# Altium footprint library mfmc_footprints.PcbLib: 156 footprints (part 6 of 10)
Each footprint in its own frame and in the unit in brackets; x right, y up, seen from the top. Pads: shape width x height; smd on the part's side, far side on the other; paste and mask are expansions set on the pad; w line width, h text height; cw(c..) or ccw(c..) is an arc to the next point about the centre after c.
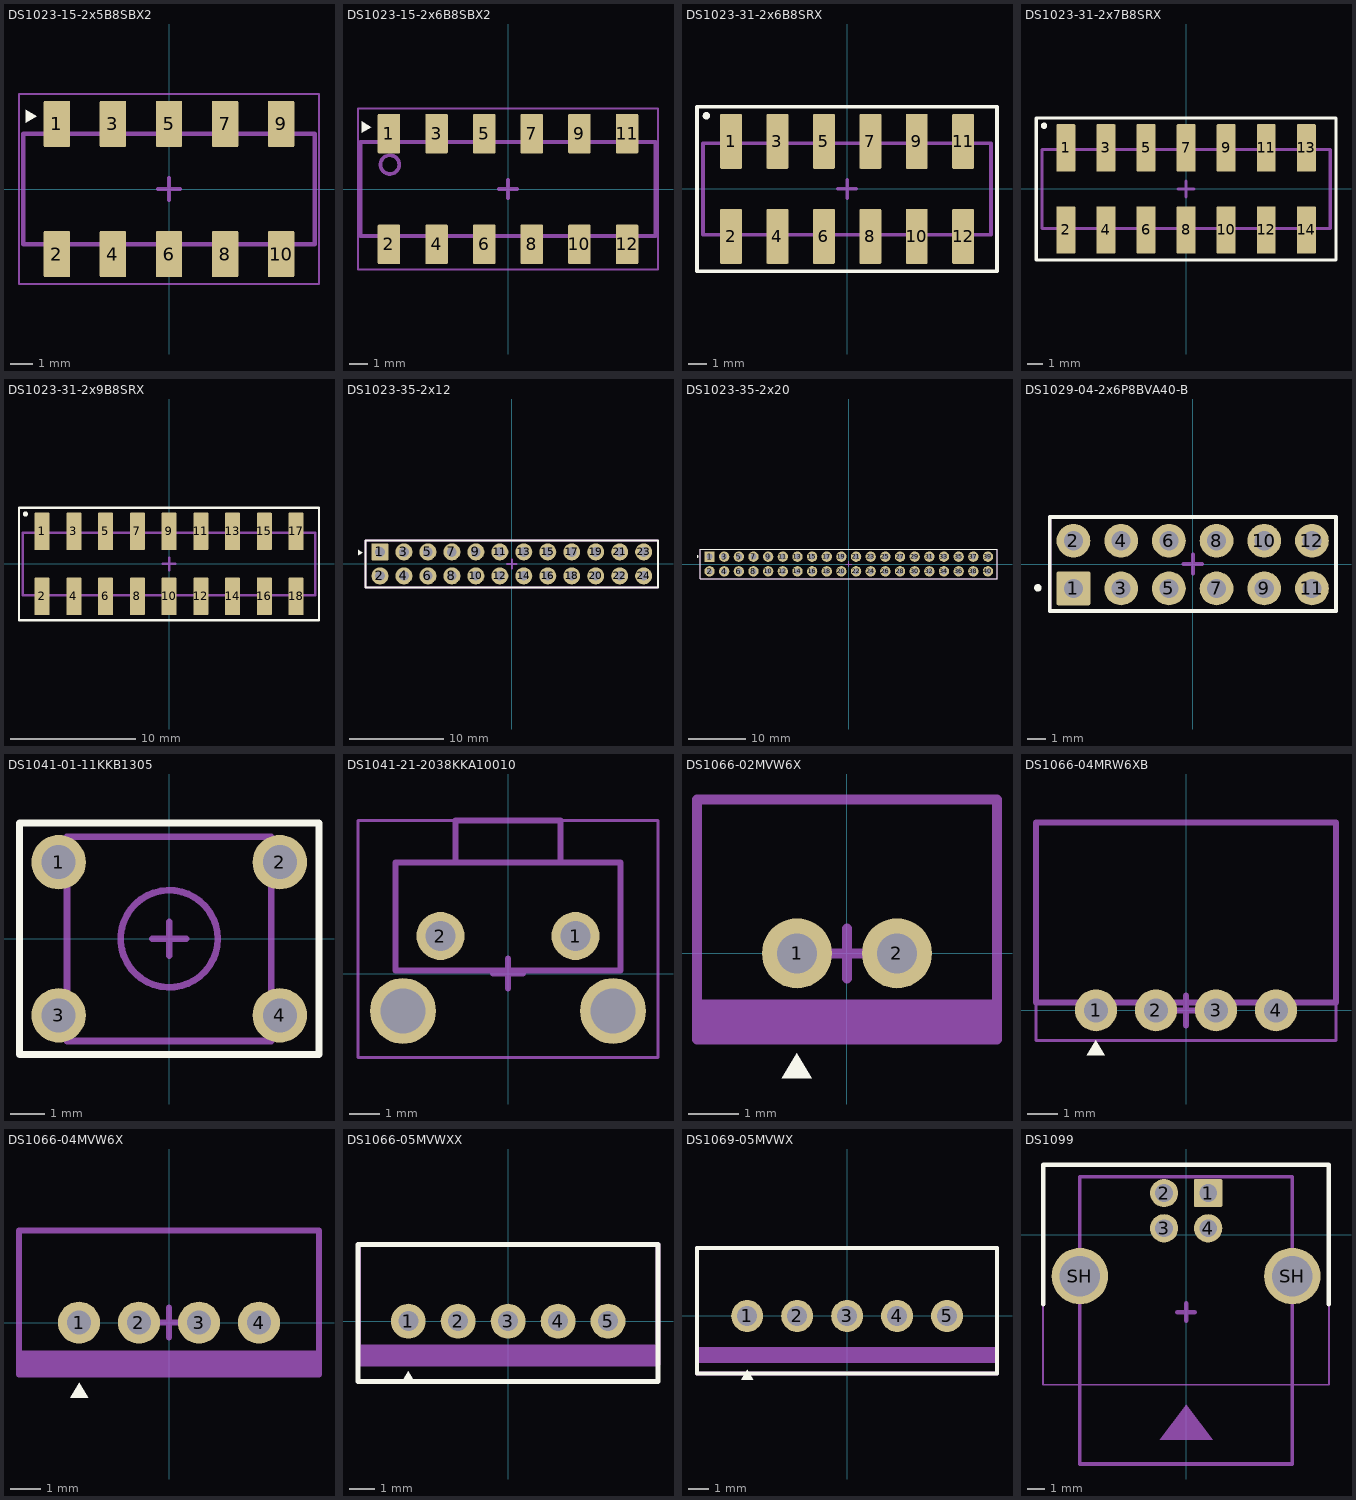
[diagram p5: the footprints below, top view; thin cyan lines are the x and y axes]

## DS1023-15-2x5B8SBX2 [mm] "Female header pitch 2.54mm SMT Type H=5.0"
height 5
pads (10):
  rrect10% 1.2x2.1 smd: 1(-5.08,2.95) 2(-5.08,-2.95) 3(-2.54,2.95) 4(-2.54,-2.95) 5(0,2.95) 6(0,-2.95) 7(2.54,2.95) 8(2.54,-2.95) 9(5.08,2.95) 10(5.08,-2.95)
Top Overlay:
  region: -6.5,3.6 -6,3.3 -6.5,3
Top Courtyard:
  lines w0.1: -6.8,-4.3 6.8,-4.3 6.8,4.3 -6.8,4.3 -6.8,-4.3
  lines w0.2: -0.5,0 0.5,0 ; 0,-0.5 0,0.5
Top Assembly:
  lines w0.2: -6.6,-2.5 6.6,-2.5 6.6,2.5 -6.6,2.5 -6.6,-2.5
Top Designator (Mech10):
  text ".Designator" at -7.618,-0.508 h1.52
3D body "DS1023-15-2x5.STEP": height 6, standoff 0, extent -6.6,-4.25 6.6,4.25

## DS1023-15-2x6B8SBX2 [mm] "Female header pitch 2.54mm SMT Type H=5.0"
height 5
pads (12):
  rrect10% 1.2x2.1 smd: 1(-6.35,2.95) 2(-6.35,-2.95) 3(-3.81,2.95) 4(-3.81,-2.95) 5(-1.27,2.95) 6(-1.27,-2.95) 7(1.27,2.95) 8(1.27,-2.95) 9(3.81,2.95) 10(3.81,-2.95) 11(6.35,2.95) 12(6.35,-2.95)
Top Overlay:
  region: -7.8,3.6 -7.3,3.3 -7.8,3
Top Courtyard:
  lines w0.1: -8,-4.3 8,-4.3 8,4.3 -8,4.3 -8,-4.3
  lines w0.2: -0.5,0 0.5,0 ; 0,-0.5 0,0.5
Top Assembly:
  circle w0.2: c-6.3,1.3 r0.5
  lines w0.2: -7.87,-2.5 7.87,-2.5 7.87,2.5 -7.87,2.5 -7.87,-2.5
Top Designator (Mech10):
  text ".Designator" at -7.618,-0.508 h1.52
3D body "DS1023-15-2x6.STEP": height 6, standoff 0, extent -7.87,-4.25 7.87,4.25

## DS1023-31-2x6B8SRX [mm]
height 9.7
pads (12):
  rrect10% 1.2x3 smd: 1(-6.35,2.6) 2(-6.35,-2.6) 3(-3.81,2.6) 4(-3.81,-2.6) 5(-1.27,2.6) 6(-1.27,-2.6) 7(1.27,2.6) 8(1.27,-2.6) 9(3.81,2.6) 10(3.81,-2.6) 11(6.35,2.6) 12(6.35,-2.6)
Top Overlay:
  circle w0.2: c-7.7,4 r0.1
  lines w0.2: -8.213,-4.513 8.2,-4.513 8.2,4.5 -8.213,4.5 -8.213,-4.513
Top Courtyard:
  lines w0.1: -8.213,-4.513 8.2,-4.513 8.2,4.5 -8.213,4.5 -8.213,-4.513
  lines w0.2: -0.5,0 0.5,0 ; 0,-0.5 0,0.5
Top Assembly:
  lines w0.2: -7.883,-2.513 7.87,-2.513 7.87,2.5 -7.883,2.5 -7.883,-2.513
Top Designator (Mech10):
  text ".Designator" at -7.624,-0.514 h1.52
3D body "DS1023-31-2x6.STEP": height 9.7, standoff 0, extent -7.87,-3.6 7.87,3.6

## DS1023-31-2x7B8SRX [mm]
height 9.7
pads (14):
  rrect10% 1.2x3 smd: 1(-7.62,2.6) 2(-7.62,-2.6) 3(-5.08,2.6) 4(-5.08,-2.6) 5(-2.54,2.6) 6(-2.54,-2.6) 7(0,2.6) 8(0,-2.6) 9(2.54,2.6) 10(2.54,-2.6) 11(5.08,2.6) 12(5.08,-2.6) 13(7.62,2.6) 14(7.62,-2.6)
Top Overlay:
  circle w0.2: c-9,4 r0.1
  lines w0.2: -9.5,-4.5 -9.5,4.5 9.5,4.5 9.5,-4.5 -9.5,-4.5
Top Courtyard:
  lines w0.1: -9.513,-4.513 9.5,-4.513 9.5,4.5 -9.513,4.5 -9.513,-4.513
  lines w0.2: -0.5,0 0.5,0 ; 0,-0.5 0,0.5
Top Assembly:
  lines w0.2: -9.14,-2.5 -9.14,2.5 9.14,2.5 9.14,-2.5 -9.14,-2.5
Top Designator (Mech10):
  text ".Designator" at -7.618,-0.508 h1.52
3D body "DS1023-31-2x7.STEP": height 9.7, standoff 0, extent -9.14,-3.6 9.14,3.6

## DS1023-31-2x9B8SRX [mm]
height 9.7
pads (18):
  rrect10% 1.2x3 smd: 1(-10.16,2.6) 2(-10.16,-2.6) 3(-7.62,2.6) 4(-7.62,-2.6) 5(-5.08,2.6) 6(-5.08,-2.6) 7(-2.54,2.6) 8(-2.54,-2.6) 9(0,2.6) 10(0,-2.6) 11(2.54,2.6) 12(2.54,-2.6) 13(5.08,2.6) 14(5.08,-2.6) 15(7.62,2.6) 16(7.62,-2.6) 17(10.16,2.6) 18(10.16,-2.6)
Top Overlay:
  circle w0.2: c-11.5,4 r0.1
  lines w0.2: -12.013,-4.513 12,-4.513 12,4.5 -12.013,4.5 -12.013,-4.513
Top Courtyard:
  lines w0.1: -12.013,-4.513 12,-4.513 12,4.5 -12.013,4.5 -12.013,-4.513
  lines w0.2: -0.5,0 0.5,0 ; 0,-0.5 0,0.5
Top Assembly:
  lines w0.2: -11.693,-2.513 11.68,-2.513 11.68,2.5 -11.693,2.5 -11.693,-2.513
Top Designator (Mech10):
  text ".Designator" at -7.624,-0.514 h1.52
3D body "1023-31.STEP": height 9.7, standoff 0, extent -11.68,-3.6 11.68,3.6

## DS1023-35-2x12 [mm]
height 13.5
pads (24):
  rrect10% 1.8x1.8 hole 1.02: 1(-13.97,1.27)
  round 1.8 hole 1.02: 2(-13.97,-1.27) 3(-11.43,1.27) 4(-11.43,-1.27) 5(-8.89,1.27) 6(-8.89,-1.27) 7(-6.35,1.27) 8(-6.35,-1.27) 9(-3.81,1.27) 10(-3.81,-1.27) 11(-1.27,1.27) 12(-1.27,-1.27) 13(1.27,1.27) 14(1.27,-1.27) 15(3.81,1.27) 16(3.81,-1.27) 17(6.35,1.27) 18(6.35,-1.27) 19(8.89,1.27) 20(8.89,-1.27) 21(11.43,1.27) 22(11.43,-1.27) 23(13.97,1.27) 24(13.97,-1.27)
Top Overlay:
  region: -16.3,1.5 -15.8,1.2 -16.3,0.9
  lines w0.2: -15.503,-2.513 15.49,-2.513 15.49,2.5 -15.503,2.5 -15.503,-2.513
Top Courtyard:
  lines w0.1: -15.49,-2.5 -15.49,2.5 15.49,2.5 15.49,-2.5 -15.49,-2.5
  lines w0.2: -0.5,0 0.5,0 ; 0,-0.5 0,0.5
Top Assembly:
  circle w0.2: c-13.97,1.27 r0.5
  lines w0.2: -15.49,-2.5 -15.49,2.5 15.49,2.5 15.49,-2.5 -15.49,-2.5
Top Designator (Mech10):
  text ".Designator" at -7.973,-0.514 h1.52
3D body "DS1023-35-2x12.STEP": height 13.5, standoff -3, extent -15.49,-2.475 15.49,2.475

## DS1023-35-2x20 [mm]
height 13.5
pads (40):
  rrect10% 1.8x1.8 hole 1.02: 1(-24.13,1.27)
  round 1.8 hole 1.02: 2(-24.13,-1.27) 3(-21.59,1.27) 4(-21.59,-1.27) 5(-19.05,1.27) 6(-19.05,-1.27) 7(-16.51,1.27) 8(-16.51,-1.27) 9(-13.97,1.27) 10(-13.97,-1.27) 11(-11.43,1.27) 12(-11.43,-1.27) 13(-8.89,1.27) 14(-8.89,-1.27) 15(-6.35,1.27) 16(-6.35,-1.27) 17(-3.81,1.27) 18(-3.81,-1.27) 19(-1.27,1.27) 20(-1.27,-1.27) 21(1.27,1.27) 22(1.27,-1.27) 23(3.81,1.27) 24(3.81,-1.27) 25(6.35,1.27) 26(6.35,-1.27) 27(8.89,1.27) 28(8.89,-1.27) 29(11.43,1.27) 30(11.43,-1.27) 31(13.97,1.27) 32(13.97,-1.27) 33(16.51,1.27) 34(16.51,-1.27) 35(19.05,1.27) 36(19.05,-1.27) 37(21.59,1.27) 38(21.59,-1.27) 39(24.13,1.27) 40(24.13,-1.27)
Top Overlay:
  circle w0.2: c-26.2,1.3 r0.1
  lines w0.2: -25.7,-2.6 25.7,-2.6 25.7,2.6 -25.7,2.6 -25.7,-2.6
Top Courtyard:
  lines w0.1: -25.7,-2.6 25.7,-2.6 25.7,2.6 -25.7,2.6 -25.7,-2.6
  lines w0.2: -0.5,0 0.5,0 ; 0,-0.5 0,0.5
Top Assembly:
  circle w0.2: c-24.13,1.27 r0.5
  lines w0.2: -25.7,-2.6 25.7,-2.6 25.7,2.6 -25.7,2.6 -25.7,-2.6
Top Designator (Mech10):
  text ".Designator" at -7.918,-0.508 h1.52
3D body "DS1023-35.STEP": height 13.5, standoff -3, extent -25.65,-2.5 25.65,2.5

## DS1029-04-2x6P8BVA40-B [mm]
height 27
pads (12):
  rrect10% 1.8x1.8 hole 1.02: 1(-6.36,-1.3)
  round 1.8 hole 1.02: 2(-6.36,1.24) 3(-3.82,-1.3) 4(-3.82,1.24) 5(-1.28,-1.3) 6(-1.28,1.24) 7(1.26,-1.3) 8(1.26,1.24) 9(3.8,-1.3) 10(3.8,1.24) 11(6.34,-1.3) 12(6.34,1.24)
Top Overlay:
  circle w0.2: c-8.255,-1.27 r0.1
  lines w0.2: -7.62,-2.5 7.62,-2.5 7.62,2.5 -7.62,2.5 -7.62,-2.5
Top Courtyard:
  lines w0.1: -7.62,-2.5 7.62,-2.5 7.62,2.5 -7.62,2.5 -7.62,-2.5
  lines w0.2: -0.5,0 0.5,0 ; 0,-0.5 0,0.5
Top Assembly:
  circle w0.2: c-6.36,-1.3 r0.5
  lines w0.2: -7.62,-2.5 7.62,-2.5 7.62,2.5 -7.62,2.5 -7.62,-2.5
Top Designator (Mech10):
  text ".Designator" at -7.985,-0.508 h1.52
3D body "DS1029-04-2x6-a6-b3-h21.STEP": height 27, standoff -3, extent -7.63,-2.53 7.61,2.47

## DS1041-01-11KKB1305 [mm] "Tact switch DIP type 6x6mm"
height 4.3
pads (4):
  round 1.6 hole 1: 1(-3.25,2.25) 2(3.25,2.25) 3(-3.25,-2.25) 4(3.25,-2.25)
Top Overlay:
  lines w0.2: -4.4,-3.4 -4.4,3.4 4.4,3.4 4.4,-3.4 -4.4,-3.4
Top Courtyard:
  lines w0.1: -4.413,-3.413 4.4,-3.413 4.4,3.4 -4.413,3.4 -4.413,-3.413
  lines w0.2: -0.5,0 0.5,0 ; 0,-0.5 0,0.5
Top Assembly:
  circle w0.2: c0,0 r1.425
  lines w0.2: -3,-3 -3,3 3,3 3,-3 -3,-3
Top Designator (Mech10):
  text ".Designator" at -7.618,-0.508 h1.52
3D body "tc-1102-a-c-r.stp": height 5, standoff -3, extent -3.667,-3 3.667,3

## DS1041-21-2038KKA10010 [mm] "6.1x6.1mm Tact Switch R/A 2 Position Type"
height 6.1
pads (4):
  round 1.6 hole 1: 1(2.25,1.25) 2(-2.25,1.25)
  round 2.2 hole 1.5: ""(-3.5,-1.25) ""(3.5,-1.25)
Top Courtyard:
  lines w0.1: -5,-2.8 5,-2.8 5,5.1 -5,5.1 -5,-2.8
  lines w0.2: -0.5,0 0.5,0 ; 0,-0.5 0,0.5
Top Assembly:
  lines w0.2: -3.75,0.1 3.75,0.1 3.75,3.7 -3.75,3.7 -3.75,0.1 ; -1.75,3.7 1.75,3.7 1.75,5.1 -1.75,5.1 -1.75,3.7
3D body "CUI_DEVICES_TS11-674-43-BK-100-RA-D.step": height 7.11, standoff -3.99, extent -4.156,-2.75 4.156,4.4

## DS1066-02MVW6X [mm] "PCB Connector 2.5mm XH Type"
height 6
pads (2):
  round 1.4 hole 0.8: 1(-1,0) 2(1,0)
Top Overlay:
  region: -1,-2 -1.3,-2.5 -0.7,-2.5
Top Courtyard:
  lines w0.1: -3,-1.724 -3,3.076 3,3.076 3,-1.724 -3,-1.724
  lines w0.2: -0.5,0 0.5,0 ; 0,-0.5 0,0.5
Top Assembly:
  rectangle: -3,-1.724 3,-0.924
  lines w0.2: -3,-1.724 -3,3.076 3,3.076 3,-1.724 -3,-1.724
Top Designator (Mech10):
  text ".Designator" at -7.624,-0.176 h1.52
3D body "B2B-PH-K-S.step": height 6.01, standoff -3.39, extent -2.95,-1.7 2.95,2.8

## DS1066-04MRW6XB [mm] "PCB Connector 2.5mm PH Type"
height 4.8
pads (4):
  round 1.4 hole 0.8: 1(-3,0) 2(-1,0) 3(1,0) 4(3,0)
Top Overlay:
  region: -3,-1 -3.3,-1.5 -2.7,-1.5
Top Courtyard:
  lines w0.1: -5,-1 5,-1 5,6.25 -5,6.25 -5,-1
  lines w0.2: -0.5,0 0.5,0 ; 0,-0.5 0,0.5
Top Assembly:
  lines w0.2: -5,0.25 5,0.25 5,6.25 -5,6.25 -5,0.25
Top Designator (Mech10):
  text ".Designator" at -7.624,-0.176 h1.52
3D body "MW-4MRB.step": height 5.01, standoff -3.39, extent -4.95,-0.25 4.95,6.25

## DS1066-04MVW6X [mm] "PCB Connector 2.5mm XH Type"
height 6
pads (4):
  round 1.4 hole 0.8: 1(-3,0) 2(-1,0) 3(1,0) 4(3,0)
Top Overlay:
  region: -3,-2 -3.3,-2.5 -2.7,-2.5
Top Courtyard:
  lines w0.1: -5,-1.724 -5,3.076 5,3.076 5,-1.724 -5,-1.724
  lines w0.2: -0.5,0 0.5,0 ; 0,-0.5 0,0.5
Top Assembly:
  rectangle: -5,-1.724 5,-0.924
  lines w0.2: -5,-1.724 -5,3.076 5,3.076 5,-1.724 -5,-1.724
Top Designator (Mech10):
  text ".Designator" at -7.624,-0.176 h1.52
3D body "User Library-MW-4M-1.STEP": height 6.01, standoff -3.39, extent -4.95,-1.45 4.95,3.35

## DS1066-05MVWXX [mm] "PCB Connector 2.5mm XH Type"
height 6
pads (5):
  round 1.4 hole 0.8: 1(-4,0) 2(-2,0) 3(0,0) 4(2,0) 5(4,0)
Top Overlay:
  region: -4,-2 -4.3,-2.5 -3.7,-2.5
  lines w0.2: -6.013,-2.413 6,-2.413 6,3.076 -6.013,3.076 -6.013,-2.413
Top Courtyard:
  lines w0.1: -6,-1.724 6,-1.724 6,3.076 -6,3.076 -6,-1.724
  lines w0.2: -0.5,0 0.5,0 ; 0,-0.5 0,0.5
Top Assembly:
  rectangle: -6,-1.724 6,-0.924
  lines w0.2: -6,-1.724 6,-1.724 6,3.076 -6,3.076 -6,-1.724
Top Designator (Mech10):
  text ".Designator" at -7.624,-0.176 h1.52
3D body "User Library-BxB-PH.STEP": height 6, standoff -3.3, extent -5.95,-1.7 5.95,2.8

## DS1069-05MVWX [mm] "PCB Connector 2.5mm XH Type"
height 7
pads (5):
  round 1.6 hole 1: 1(-5,0) 2(-2.5,0) 3(0,0) 4(2.5,0) 5(5,0)
Top Overlay:
  region: -5,-2.7 -5.3,-3.2 -4.7,-3.2
  lines w0.2: -7.513,-2.888 7.5,-2.888 7.5,3.4 -7.513,3.4 -7.513,-2.888
Top Courtyard:
  lines w0.1: -7.513,-2.888 7.5,-2.888 7.5,3.4 -7.513,3.4 -7.513,-2.888
  lines w0.2: -0.5,0 0.5,0 ; 0,-0.5 0,0.5
Top Assembly:
  region: 7.5,-1.55 -7.5,-1.55 -7.5,-2.35 7.5,-2.35
  lines w0.2: -7.513,-2.888 7.5,-2.888 7.5,3.4 -7.513,3.4 -7.513,-2.888
Top Designator (Mech10):
  text ".Designator" at -7.624,-0.358 h1.52
3D body "User Library-BxB-XH_mod.STEP": height 7, standoff -3.3, extent -7.45,-2.35 7.45,3.4

## DS1099 [mm] "USB Type-B R/A DIP Type Connector"
height 10.8
pads (6):
  rrect10% 1.6x1.6 hole 1: 1(1.25,2.355)
  round 1.6 hole 1: 2(-1.25,2.355) 3(-1.25,0.355) 4(1.25,0.355)
  round 3.2 hole 2.3: SH(-6.02,-2.355) SH(6.02,-2.355)
Top Overlay:
  lines w0.254: -8.1,-3.945 -8.1,3.955 8.1,3.955 8.1,-3.945
Top Courtyard:
  lines w0.1: -8.113,-8.513 8.1,-8.513 8.1,4 -8.113,4 -8.113,-8.513
  lines w0.254: -0.5,-4.4 0.5,-4.4 ; 0,-4.9 0,-3.9
Top Assembly:
  region: -1.5,-11.645 0,-9.645 1.5,-11.645
  lines w0.2: -6.02,-13.01 6.02,-13.01 6.02,3.29 -6.02,3.29 -6.02,-13.01
Top Designator (Mech10):
  text ".Designator" at -7.618,-5.022 h1.52
3D body "61410416121r.stp": height 11.01, standoff -2.19, extent -6.2,-12.805 6.2,3.795